# Altium footprint library OpenRec.PcbLib: 90 footprints (part 1 of 6)
Each footprint in its own frame and in the unit in brackets; x right, y up, seen from the top. Pads: shape width x height; smd on the part's side, far side on the other; paste and mask are expansions set on the pad; w line width, h text height; cw(c..) or ccw(c..) is an arc to the next point about the centre after c.
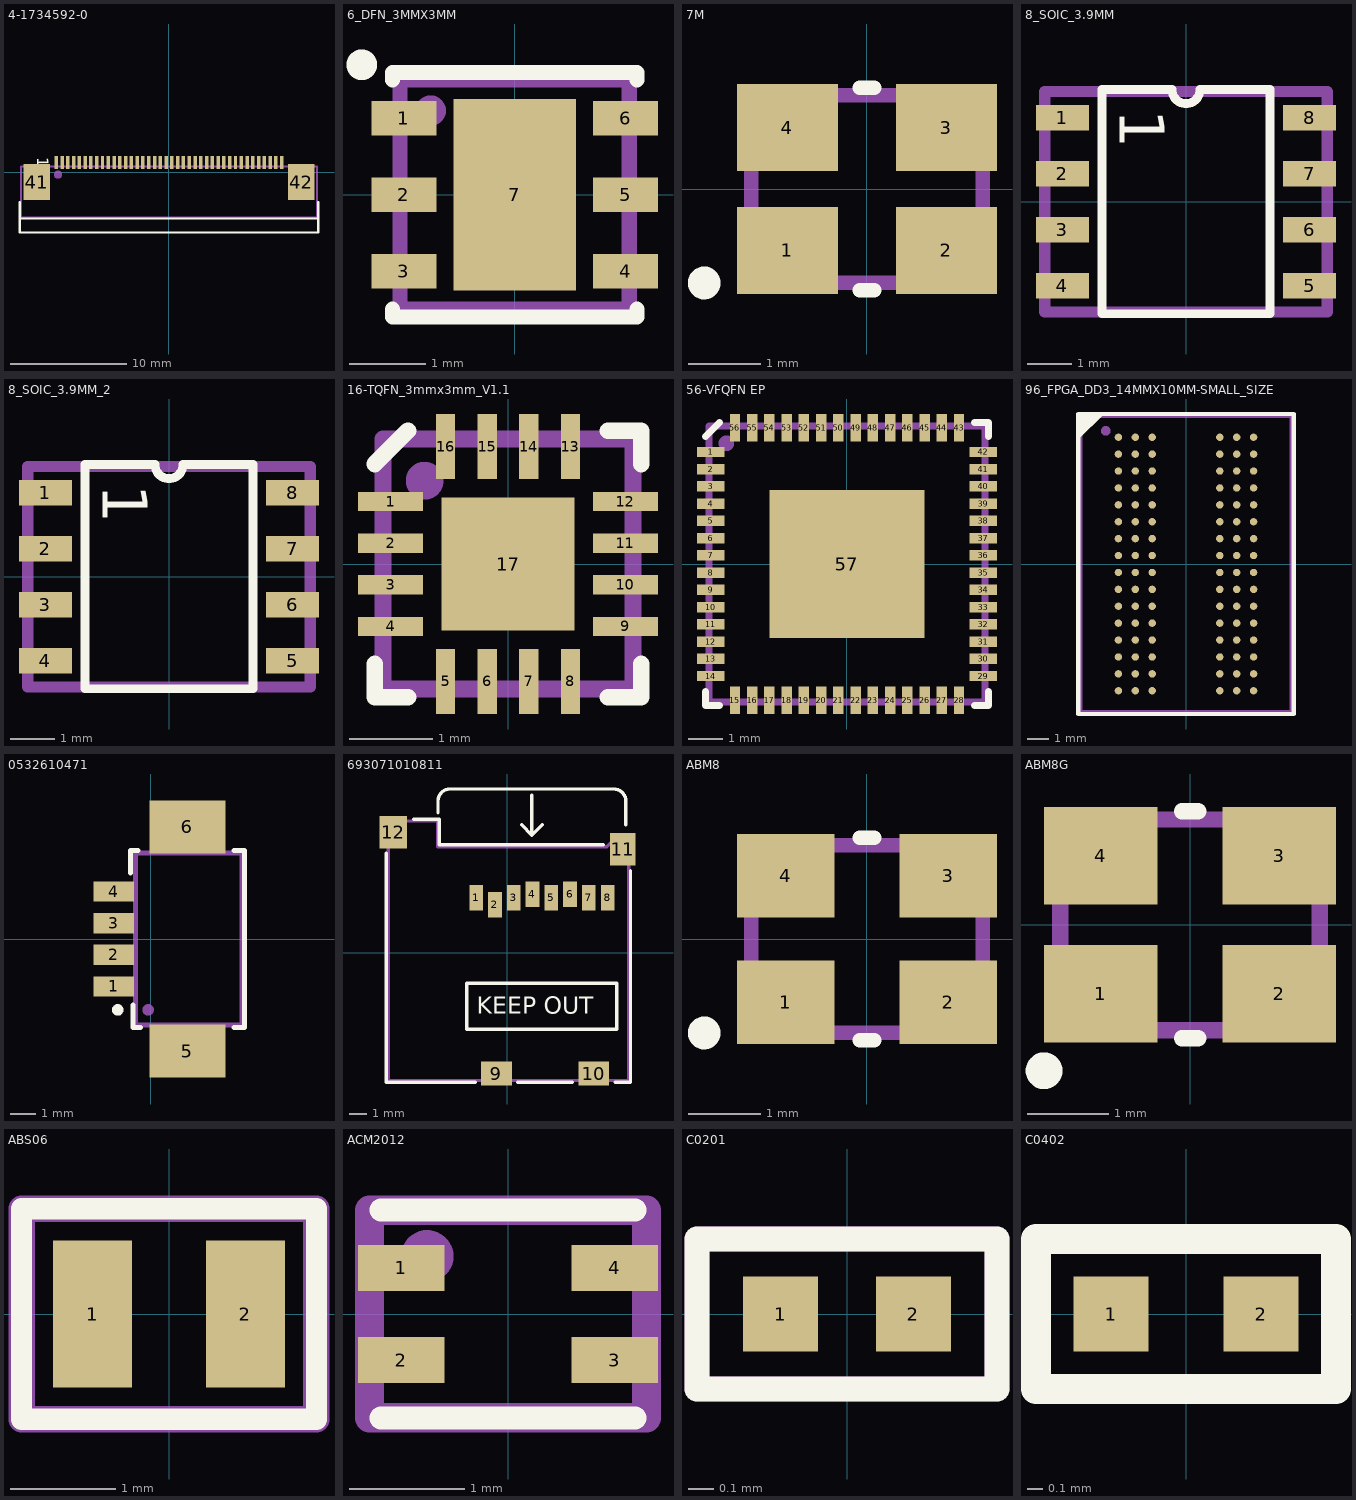
[diagram p0: the footprints below, top view; thin cyan lines are the x and y axes]

## 4-1734592-0 [mm]
pads (42):
  rect 0.3x1.1 smd mask+0.025: 1(-9.75,0.85) 2(-9.25,0.85) 3(-8.75,0.85) 4(-8.25,0.85) 5(-7.75,0.85) 6(-7.25,0.85) 7(-6.75,0.85) 8(-6.25,0.85) 9(-5.75,0.85) 10(-5.25,0.85) 11(-4.75,0.85) 12(-4.25,0.85) 13(-3.75,0.85) 14(-3.25,0.85) 15(-2.75,0.85) 16(-2.25,0.85) 17(-1.75,0.85) 18(-1.25,0.85) 19(-0.75,0.85) 20(-0.25,0.85) 21(0.25,0.85) 22(0.75,0.85) 23(1.25,0.85) 24(1.75,0.85) 25(2.25,0.85) 26(2.75,0.85) 27(3.25,0.85) 28(3.75,0.85) 29(4.25,0.85) 30(4.75,0.85) 31(5.25,0.85) 32(5.75,0.85) 33(6.25,0.85) 34(6.75,0.85) 35(7.25,0.85) 36(7.75,0.85) 37(8.25,0.85) 38(8.75,0.85) 39(9.25,0.85) 40(9.75,0.85)
  rect 2.3x3.1 smd mask+0.076: 41(-11.42,-0.85) 42(11.42,-0.85)
Top Overlay:
  lines w0.2: -12.9,-2.6 -12.9,-4 ; 12.9,-2.6 12.9,-4 ; -12.9,-4 12.9,-4 ; -12.9,-4 -12.9,-5.2 12.9,-5.2 12.9,-4
  text "1" at -11.4,1.3 h1.02
Mechanical 29:
  circle w0.5: c-9.6,-0.2 r0.1
  lines w0.2: -12.8,-3.9 -12.8,0.5 12.8,0.5 12.8,-3.9 -12.8,-3.9
  text ".Designator" at -0.7,-0.5 h1.52
3D body "c-4-1734592-0-c-3d.stp": height 2.05, standoff 0, extent -12.715,-3.955 12.715,1.155

## 6_DFN_3MMX3MM [mm]
pads (7):
  rect 0.85x0.45 smd mask+0.045: 1(-1.45,1) 2(-1.45,0) 3(-1.45,-1) 4(1.45,-1) 5(1.45,0) 6(1.45,1)
  rect 1.6x2.5 smd mask+0.045: 7(0,0)
Top Overlay:
  circle w0.3: c-2,1.7 r0.05
  lines w0.2: -1.6,-1.5 -1.6,-1.6 1.6,-1.6 1.6,-1.5 ; -1.6,1.5 -1.6,1.6 1.6,1.6 1.6,1.5
Mechanical 29:
  circle w0.3: c-1.1,1.1 r0.05
  lines w0.2: -1.5,-1.5 -1.5,1.5 1.5,1.5 1.5,-1.5 -1.5,-1.5
  text ".Designator" at -1,-0.5 h0.8
3D body: height 1.13, standoff 1, extent -1.51,0 1.51,1.5
3D body "SHT21.step": height 1.12, standoff 0, extent -1.51,-1.5 1.51,1.5

## 7M [mm]
pads (4):
  rect 1.4x1.2 smd mask+0.1: 1(-1.1,-0.85) 2(1.1,-0.85) 3(1.1,0.85) 4(-1.1,0.85)
Top Overlay:
  circle w0.254: c-2.25,-1.3 r0.1
  lines w0.2: -0.1,-1.4 0.1,-1.4 ; -0.1,1.4 0.1,1.4
Mechanical 29:
  circle w0.254: c-1.2,-0.9 r0.1
  lines w0.2: -1.6,-1.3 -1.6,1.3 1.6,1.3 1.6,-1.3 -1.6,-1.3
  text ".Designator" at 0.4,-0.7 h0.8
3D body "Crystal TXC Corp 7M series.step": height 0.8, standoff 0, extent -1.65,-1.3 1.65,1.3

## 8_SOIC_3.9MM [mm]
pads (8):
  rect 1.2x0.58 smd: 1(-2.8,1.905) 2(-2.8,0.635) 3(-2.8,-0.635) 4(-2.8,-1.905) 5(2.8,-1.905) 6(2.8,-0.635) 7(2.8,0.635) 8(2.8,1.905)
Top Overlay:
  lines w0.2: -1.905,-2.54 -1.905,2.54 -0.318,2.54 ccw(c0,2.54) 0.318,2.54 1.905,2.54 1.905,-2.54 -1.905,-2.54
  text "1" at -1.5,2.1 h1.02
Mechanical 29:
  circle w0.254: c-2.7,1.9 r0.1
  lines w0.254: -3.2,-2.5 3.2,-2.5 3.2,2.5 -3.2,2.5 -3.2,-2.5
  text ".Designator" at -1.7,-0.8 h1.52
3D body "SOIC-8-1.step": height 1.75, standoff 0, extent -3,-2.45 3,2.45

## 8_SOIC_3.9MM_2 [mm]
pads (8):
  rect 1.2x0.58 smd: 1(-2.8,1.905) 2(-2.8,0.635) 3(-2.8,-0.635) 4(-2.8,-1.905) 5(2.8,-1.905) 6(2.8,-0.635) 7(2.8,0.635) 8(2.8,1.905)
Top Overlay:
  lines w0.2: -1.905,-2.54 -1.905,2.54 -0.318,2.54 ccw(c0,2.54) 0.318,2.54 1.905,2.54 1.905,-2.54 -1.905,-2.54
  text "1" at -1.5,2.1 h1.02
Mechanical 29:
  circle w0.254: c-2.7,1.9 r0.1
  lines w0.254: -3.2,-2.5 3.2,-2.5 3.2,2.5 -3.2,2.5 -3.2,-2.5
  text ".Designator" at -0.9,-0.7 h1.52
3D body "SOIC-8-1.step": height 1.75, standoff 0, extent -3,-2.45 3,2.45

## 16-TQFN_3mmx3mm_V1.1 [mm]
pads (17):
  rect 0.78x0.23 smd mask+0.03: 1(-1.41,0.75) 2(-1.41,0.25) 3(-1.41,-0.25) 4(-1.41,-0.75) 9(1.41,-0.75) 10(1.41,-0.25) 11(1.41,0.25) 12(1.41,0.75)
  rect 0.23x0.78 smd mask+0.03: 5(-0.75,-1.41) 6(-0.25,-1.41) 7(0.25,-1.41) 8(0.75,-1.41) 13(0.75,1.41) 14(0.25,1.41) 15(-0.25,1.41) 16(-0.75,1.41)
  rect 1.6x1.6 smd mask+0.03: 17(0,0)
Top Overlay:
  lines w0.2: -1.6,-1.2 -1.6,-1.6 -1.2,-1.6 ; -1.6,1.2 -1.2,1.6 ; 1.2,-1.6 1.6,-1.6 1.6,-1.2 ; 1.2,1.6 1.6,1.6 1.6,1.2
Mechanical 29:
  circle w0.254: c-1,1 r0.1
  lines w0.2: -1.5,-1.5 1.5,-1.5 1.5,1.5 -1.5,1.5 -1.5,-1.5
  text ".Designator" at -0.3,1 h0.8
3D body "QFN-16.step": height 0.9, standoff 0, extent -1.501,-1.501 1.501,1.501

## 56-VFQFN EP [mm]
pads (57):
  rect 0.8x0.3 smd mask+0.03: 1(-3.95,3.25) 2(-3.95,2.75) 3(-3.95,2.25) 4(-3.95,1.75) 5(-3.95,1.25) 6(-3.95,0.75) 7(-3.95,0.25) 8(-3.95,-0.25) 9(-3.95,-0.75) 10(-3.95,-1.25) 11(-3.95,-1.75) 12(-3.95,-2.25) 13(-3.95,-2.75) 14(-3.95,-3.25) 29(3.95,-3.25) 30(3.95,-2.75) 31(3.95,-2.25) 32(3.95,-1.75) 33(3.95,-1.25) 34(3.95,-0.75) 35(3.95,-0.25) 36(3.95,0.25) 37(3.95,0.75) 38(3.95,1.25) 39(3.95,1.75) 40(3.95,2.25) 41(3.95,2.75) 42(3.95,3.25)
  rect 0.3x0.8 smd mask+0.03: 15(-3.25,-3.95) 16(-2.75,-3.95) 17(-2.25,-3.95) 18(-1.75,-3.95) 19(-1.25,-3.95) 20(-0.75,-3.95) 21(-0.25,-3.95) 22(0.25,-3.95) 23(0.75,-3.95) 24(1.25,-3.95) 25(1.75,-3.95) 26(2.25,-3.95) 27(2.75,-3.95) 28(3.25,-3.95) 43(3.25,3.95) 44(2.75,3.95) 45(2.25,3.95) 46(1.75,3.95) 47(1.25,3.95) 48(0.75,3.95) 49(0.25,3.95) 50(-0.25,3.95) 51(-0.75,3.95) 52(-1.25,3.95) 53(-1.75,3.95) 54(-2.25,3.95) 55(-2.75,3.95) 56(-3.25,3.95)
  rect 4.5x4.3 smd paste-10 mask+0.03: 57(0,0)
Top Overlay:
  lines w0.2: -4.1,-3.7 -4.1,-4.1 -3.7,-4.1 ; -4.1,3.7 -3.7,4.1 ; 3.7,-4.1 4.1,-4.1 4.1,-3.7 ; 3.7,4.1 4.1,4.1 4.1,3.7
Top Paste:
  rectangle: -2.1,0.1 -0.1,2
  region: 2.1,2 0.1,2 0.1,0.1 2.1,0.1
  rectangle: -2.1,-2 -0.1,-0.1
  region: 2.1,-0.1 0.1,-0.1 0.1,-2 2.1,-2
Mechanical 29:
  circle w0.254: c-3.5,3.5 r0.1
  lines w0.2: -4,-4 -4,4 4,4 4,-4 -4,-4
  text ".Designator" at 0.8,-1.2 h1.52
3D body: height 0.9, standoff 0, extent -4,-4 4,4

## 96_FPGA_DD3_14MMX10MM-SMALL_SIZE [mm]
pads (96):
  round 0.35 smd mask+0.05: A1(-3.2,6) A2(-2.4,6) A3(-1.6,6) A7(1.6,6) A8(2.4,6) A9(3.2,6) B1(-3.2,5.2) B2(-2.4,5.2) B3(-1.6,5.2) B7(1.6,5.2) B8(2.4,5.2) B9(3.2,5.2) C1(-3.2,4.4) C2(-2.4,4.4) C3(-1.6,4.4) C7(1.6,4.4) C8(2.4,4.4) C9(3.2,4.4) D1(-3.2,3.6) D2(-2.4,3.6) D3(-1.6,3.6) D7(1.6,3.6) D8(2.4,3.6) D9(3.2,3.6) E1(-3.2,2.8) E2(-2.4,2.8) E3(-1.6,2.8) E7(1.6,2.8) E8(2.4,2.8) E9(3.2,2.8) F1(-3.2,2) F2(-2.4,2) F3(-1.6,2) F7(1.6,2) F8(2.4,2) F9(3.2,2) G1(-3.2,1.2) G2(-2.4,1.2) G3(-1.6,1.2) G7(1.6,1.2) G8(2.4,1.2) G9(3.2,1.2) H1(-3.2,0.4) H2(-2.4,0.4) H3(-1.6,0.4) H7(1.6,0.4) H8(2.4,0.4) H9(3.2,0.4) J1(-3.2,-0.4) J2(-2.4,-0.4) J3(-1.6,-0.4) J7(1.6,-0.4) J8(2.4,-0.4) J9(3.2,-0.4) K1(-3.2,-1.2) K2(-2.4,-1.2) K3(-1.6,-1.2) K7(1.6,-1.2) K8(2.4,-1.2) K9(3.2,-1.2) L1(-3.2,-2) L2(-2.4,-2) L3(-1.6,-2) L7(1.6,-2) L8(2.4,-2) L9(3.2,-2) M1(-3.2,-2.8) M2(-2.4,-2.8) M3(-1.6,-2.8) M7(1.6,-2.8) M8(2.4,-2.8) M9(3.2,-2.8) N1(-3.2,-3.6) N2(-2.4,-3.6) N3(-1.6,-3.6) N7(1.6,-3.6) N8(2.4,-3.6) N9(3.2,-3.6) P1(-3.2,-4.4) P2(-2.4,-4.4) P3(-1.6,-4.4) P7(1.6,-4.4) P8(2.4,-4.4) P9(3.2,-4.4) R1(-3.2,-5.2) R2(-2.4,-5.2) R3(-1.6,-5.2) R7(1.6,-5.2) R8(2.4,-5.2) R9(3.2,-5.2) T1(-3.2,-6) T2(-2.4,-6) T3(-1.6,-6) T7(1.6,-6) T8(2.4,-6) T9(3.2,-6)
Top Overlay:
  region: -5.025,7.025 -3.975,7.025 -5.025,5.975
  lines w0.2: -5.1,-7.1 5.1,-7.1 5.1,7.1 -5.1,7.1 -5.1,-7.1
Mechanical 29:
  circle w0.254: c-3.8,6.3 r0.1
  lines w0.2: -5,-7 -5,7 5,7 5,-7 -5,-7
  text ".Designator" at -0.5,1.5 h1.52
3D body: height 1.2, standoff 0, extent -5,-7 5,7

## 0532610471 [mm]
pads (6):
  rect 1.6x0.8 smd mask+0.06: 1(-1.45,-1.875) 2(-1.45,-0.625) 3(-1.45,0.625) 4(-1.45,1.875)
  rect 3x2.1 smd mask+0.06: 5(1.45,-4.425) 6(1.45,4.425)
Top Overlay:
  circle w0.254: c-1.3,-2.8 r0.1
  lines w0.2: -0.8,2.6 -0.8,3.5 -0.5,3.5 ; -0.7,-2.6 -0.7,-3.5 -0.4,-3.5 ; 3.3,-3.5 3.7,-3.5 3.7,3.5 3.3,3.5
Mechanical 29:
  circle w0.254: c-0.1,-2.8 r0.1
  lines w0.2: -0.6,-3.4 -0.6,3.4 3.6,3.4 3.6,-3.4 -0.6,-3.4
  text ".Designator" at 2.3,-2 h1.52
3D body "532610471.stp": height 3.39, standoff -0.01, extent -1.6,-5.075 3.6,5.075

## 693071010811 [mm]
pads (12):
  rect 0.8x1.5 smd mask+0.09: 1(-1.815,3.225) 2(-0.715,2.825) 3(0.385,3.225) 4(1.485,3.425) 5(2.585,3.225) 6(3.685,3.425) 7(4.785,3.225) 8(5.885,3.225)
  rect 1.8x1.4 smd: 9(-0.625,-7.075) 10(5.075,-7.075)
  rect 1.5x1.9 smd: 11(6.775,6.075)
  rect 1.6x1.9 smd: 12(-6.675,7.075)
Top Overlay:
  lines w0.2: -7.075,5.825 -7.075,-7.575 -1.875,-7.575 ; -5.475,7.825 -3.975,7.825 -3.975,6.325 5.625,6.325 ; -4.05,8.2 -4.05,8.9 cw(c-3.35,8.9) -3.35,9.6 6.25,9.6 cw(c6.25,8.9) 6.95,8.9 6.95,7.5 ; 0.625,-7.575 3.825,-7.575 ; 0.85,7.5 1.45,6.9 ; 1.45,9.25 1.45,6.9 ; 2.05,7.5 1.45,6.9 ; 6.325,-7.575 7.225,-7.575 7.225,4.825 ; -2.375,-4.475 -2.375,-1.775 6.425,-1.775 6.425,-4.475 -2.375,-4.475
  text "KEEP OUT" at -1.775,-3.575 h1
Mechanical 29:
  lines w0.2: -6.975,-7.475 7.125,-7.475 7.125,6.725 6.325,6.725 5.825,6.225 -4.075,6.225 -4.075,7.725 -6.975,7.725 -6.975,-7.475
  text ".Designator" at 4.2,1.1 h3
3D body "693071010811.stp": height 1.83, standoff -0.07, extent -6.875,-7.46 7.125,7.75

## ABM8 [mm]
pads (4):
  rect 1.35x1.15 smd mask+0.1: 1(-1.125,-0.875) 2(1.125,-0.875) 3(1.125,0.875) 4(-1.125,0.875)
Top Overlay:
  circle w0.254: c-2.25,-1.3 r0.1
  lines w0.2: -0.1,-1.4 0.1,-1.4 ; -0.1,1.4 0.1,1.4
Mechanical 29:
  circle w0.254: c-1.1,-0.9 r0.1
  lines w0.2: -1.6,-1.3 1.6,-1.3 1.6,1.3 -1.6,1.3 -1.6,-1.3
  text ".Designator" at -0.55,-0.4 h0.8
3D body: height 0.76, standoff 0.6, extent -1.3,-1 1.3,1
3D body "ABM8.step": height 0.75, standoff -0.01, extent -1.6,-1.25 1.6,1.25

## ABM8G [mm]
pads (4):
  rect 1.4x1.2 smd mask+0.1: 1(-1.1,-0.85) 2(1.1,-0.85) 3(1.1,0.85) 4(-1.1,0.85)
Top Overlay:
  circle w0.254: c-1.8,-1.8 r0.1
  lines w0.2: -0.1,-1.4 0.1,-1.4 ; -0.1,1.4 0.1,1.4
Mechanical 29:
  circle w0.254: c-1.1,-0.9 r0.1
  lines w0.2: -1.6,-1.3 -1.6,1.3 1.6,1.3 1.6,-1.3 -1.6,-1.3
  text ".Designator" at -0.7,-0.4 h0.8
3D body "ABM8G.step": height 1.01, standoff 0, extent -1.6,-1.25 1.6,1.25
3D body: height 1.02, standoff 0.98, extent -1.15,-0.9 1.15,0.9

## ABS06 [mm]
pads (2):
  rect 0.75x1.4 smd: 1(-0.725,0) 2(0.725,0)
Top Overlay:
  lines w0.2: -1.4,-1 1.4,-1 1.4,1 -1.4,1 -1.4,0 -1.4,-1
Mechanical 29:
  lines w0.254: -1.4,-1 -1.4,1 1.4,1 1.4,-1 -1.4,-1
  text ".Designator" at -0.5,-0.3 h0.6
3D body: height 0.61, standoff 0.5, extent -0.825,-0.36 0.825,0.34
3D body "ABS06.STEP": height 0.6, standoff 0, extent -1,-0.62 1,0.6

## ACM2012 [mm]
pads (4):
  rect 0.75x0.4 smd mask+0.076: 1(-0.925,0.4) 2(-0.925,-0.4) 3(0.925,-0.4) 4(0.925,0.4)
Top Overlay:
  lines w0.2: -1.1,-0.9 1.1,-0.9 ; -1.1,0.9 1.1,0.9
Mechanical 29:
  circle w0.254: c-0.7,0.5 r0.1
  lines w0.254: -1.2,-0.9 -1.2,0.9 1.2,0.9 1.2,-0.9 -1.2,-0.9
  text ".Designator" at -0.3,-0.3 h0.6
3D body: height 1.3, standoff 0, extent -1.2,-0.7 1.2,0.7

## C0201 [mm]
pads (2):
  rect 0.3x0.3 smd mask+0.04: 1(-0.265,0) 2(0.265,0)
Top Overlay:
  lines w0.1: -0.6,-0.3 0.6,-0.3 0.6,0.3 -0.6,0.3 -0.6,-0.3
Mechanical 29:
  lines w0.1: -0.6,-0.3 0.6,-0.3 0.6,0.3 -0.6,0.3 -0.6,-0.3
  text ".Designator" at -0.5,-0.1 h0.25
3D body "C0201.step": height 0.3, standoff 0, extent -0.3,-0.15 0.3,0.15

## C0402 [mm]
pads (2):
  rect 0.5x0.5 smd: 1(-0.5,0) 2(0.5,0)
Top Overlay:
  lines w0.2: -1,-0.5 1,-0.5 1,0.5 -1,0.5 -1,-0.5
Mechanical 29:
  lines w0.15: -1,-0.5 1,-0.5 1,0.5 -1,0.5 -1,-0.5
  text ".Designator" at 0.7,0.2 h0.4
3D body "CAPC1005X56N EIA 0402.step": height 0.56, standoff 0, extent -0.5,-0.25 0.5,0.25